# Altium footprint library DrPCB.PcbLib: 910 footprints (part 17 of 57)
Each footprint in its own frame and in the unit in brackets; x right, y up, seen from the top. Pads: shape width x height; smd on the part's side, far side on the other; paste and mask are expansions set on the pad; w line width, h text height; cw(c..) or ccw(c..) is an arc to the next point about the centre after c.
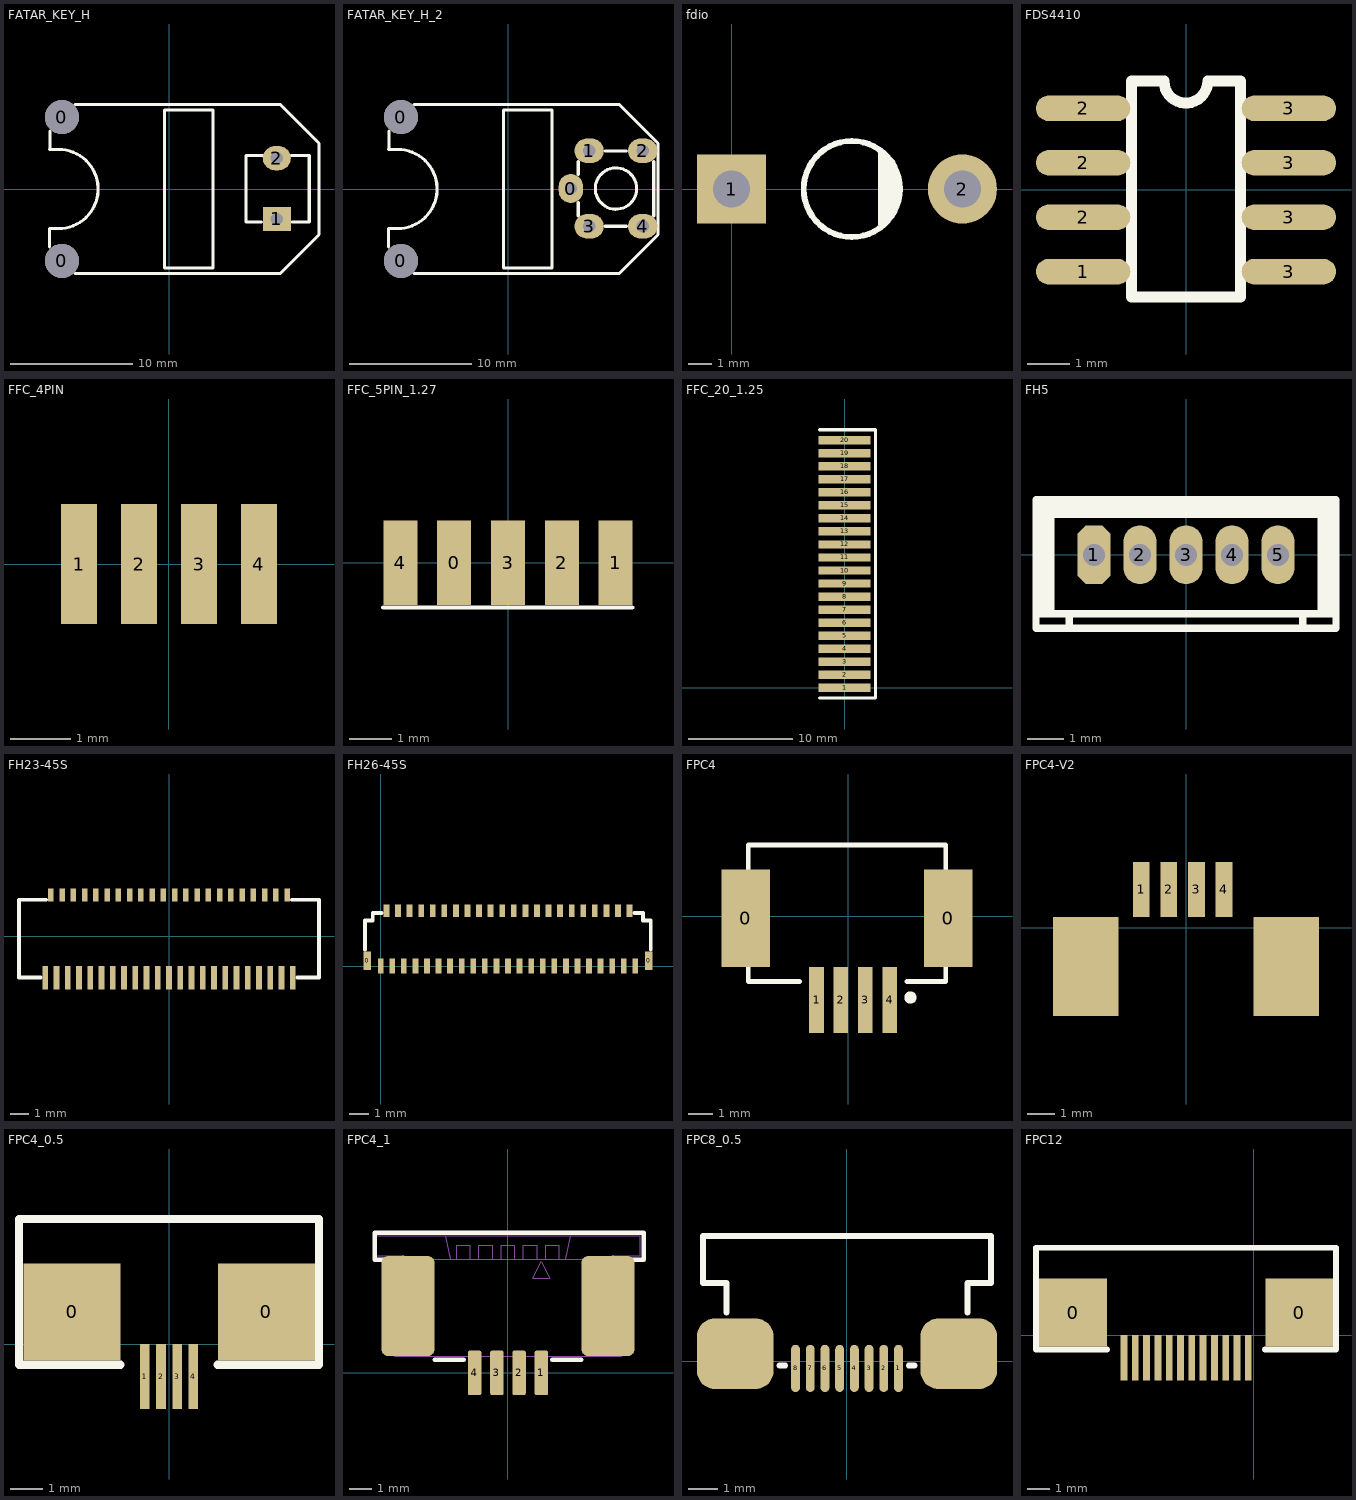
[diagram p16: the footprints below, top view; thin cyan lines are the x and y axes]

## FATAR_KEY_H [mm]
pads (4):
  round 2.8 hole 2.8: 0(-8.827,-5.9) 0(-8.827,5.9)
  rect 2.3x2 hole 1: 1(8.827,-2.462)
  oval 2.3x2 hole 1: 2(8.827,2.538)
Top Overlay:
  lines w0.254: -9.829,-4.762 -9.829,-3.251 -9.817,-3.251 -9.1,-3.251 ccw(c-9.1,-0.001) -9.1,3.249 -9.814,3.249 ; -9.829,3.264 -9.814,3.249 ; -9.814,4.761 -9.814,3.249 ; -7.733,-6.947 9.094,-6.947 ; -7.733,6.95 9.094,6.95 ; 7.57,-2.718 7.568,-2.716 6.287,-2.716 6.287,2.745 7.67,2.745 7.684,2.731 ; 9.093,-6.95 12.293,-3.75 ; 9.093,6.95 12.293,3.75 12.293,-3.75 ; 9.996,2.743 9.998,2.745 11.494,2.745 11.494,-2.716 10.087,-2.716 10.085,-2.718 ; 12.293,-3.75 12.293,-3.75 ; -0.407,-6.5 3.593,-6.5 3.593,6.5 -0.407,6.5 -0.407,-6.5

## FATAR_KEY_H_2 [mm]
pads (7):
  round 2.8 hole 2.8: 0(-8.827,-5.9) 0(-8.827,5.9)
  oval 2x2.4 hole 1: 0(5.14,0.038)
  oval 2.4x2 hole 1: 1(6.64,3.138) 2(11.04,3.138) 3(6.64,-3.062) 4(11.04,-3.062)
Top Overlay:
  circle w0.254: c8.84,0.038 r1.7
  lines w0.254: -9.829,-4.763 -9.829,-3.251 -9.817,-3.251 -9.1,-3.251 ccw(c-9.1,-0.001) -9.1,3.249 -9.814,3.249 ; -9.829,3.264 -9.814,3.249 ; -9.814,4.761 -9.814,3.249 ; -7.733,-6.947 9.094,-6.947 ; -7.733,6.95 9.094,6.95 ; 5.74,-2.197 5.74,-1.105 ; 5.741,1.181 5.741,2.273 ; 7.951,-3.062 9.716,-3.062 ; 7.951,3.138 9.716,3.138 ; 9.093,-6.95 12.293,-3.75 ; 9.093,6.95 12.293,3.75 12.293,-3.75 ; 11.94,-2.197 11.94,2.273 ; 12.293,-3.75 12.293,-3.75 ; -0.407,-6.5 3.593,-6.5 3.593,6.5 -0.407,6.5 -0.407,-6.5

## fdio [mm]
pads (2):
  rect 3x3 hole 1.6: 1(0,0)
  round 3 hole 1.6: 2(10,0)
Top Overlay:
  circle w0.254: c5.207,0 r2.083
  lines w0.254: 6.477,1.651 6.477,-1.524 6.985,-1.016 6.985,1.143 6.858,1.27 6.858,-1.016 ; 6.604,1.524 6.604,-1.27 7.112,-0.762 7.112,0.508

## FDS4410 [mm]
pads (8):
  oval 2.2x0.6 smd: 1(-2.4,-1.905) 2(-2.4,-0.635) 2(-2.4,0.635) 2(-2.4,1.905) 3(2.4,-1.905) 3(2.4,-0.635) 3(2.4,0.635) 3(2.4,1.905)
Top Overlay:
  lines w0.254: -0.513,2.54 ccw(c-0.002,2.54) 0.508,2.54 1.27,2.54 1.27,-2.5 -1.27,-2.5 -1.27,2.54 -0.508,2.54
3D body "User Library-SOIC-8-1.step": height 1.75, standoff 0, extent -3,-2.45 3,2.45

## FFC_4PIN [mm]
pads (4):
  rect 0.6x2 smd: 1(-1.5,0) 2(-0.5,0) 3(0.5,0) 4(1.5,0)

## FFC_5PIN_1.27 [mm]
pads (5):
  rect 0.8x2 smd: 0(-1.27,0) 1(2.54,0) 2(1.27,0) 3(0,0) 4(-2.54,0)
Top Overlay:
  lines w0.1: -2.946,-1.054 2.934,-1.054

## FFC_20_1.25 [mm]
pads (20):
  rect 5x0.8 smd: 1(0,0) 2(0,1.25) 3(0,2.5) 4(0,3.75) 5(0,5) 6(0,6.25) 7(0,7.5) 8(0,8.75) 9(0,10) 10(0,11.25) 11(0,12.5) 12(0,13.75) 13(0,15) 14(0,16.25) 15(0,17.5) 16(0,18.75) 17(0,20) 18(0,21.25) 19(0,22.5) 20(0,23.75)
Top Overlay:
  lines w0.3: -2.375,-0.965 2.972,-0.965 2.972,24.714 ; -2.375,24.74 2.972,24.74

## FH5 [mm] "JST GH Series, pitch: 1.25mm, 1.0A/50v"
pads (5):
  oct 0.9x1.6 hole 0.6: 1(-2.5,0)
  oval 0.9x1.6 hole 0.6: 2(-1.25,0) 3(0,0) 4(1.25,0) 5(2.5,0)
Top Overlay:
  region: -4.075,-1.6 -4.075,1.5 4.075,1.5 4.075,1.1 -3.675,1.1 -3.675,-1.6
  region: 3.675,-1.6 4.075,-1.6 4.075,1.5 3.675,1.5
  lines w0.2: -4.075,-1.6 4.075,-1.6 ; -3.675,-1.6 -3.675,1.1 4.075,1.1 ; -3.175,-2 -3.175,-1.6 ; 3.175,-2 3.175,-1.6 ; 3.675,-1.6 3.675,1.1 ; -4.075,-2 4.075,-2 4.075,1.5 -4.075,1.5 -4.075,-2
3D body "JST - GH - Thru (V) - 5Pin - 1.25mm.stp": height 4.22, standoff -2.26, extent -3.998,-1.93 3.998,1.397

## FH23-45S [mm]
pads (45):
  rect 0.3x1.25 smd: 1(-6.6,-2.212) 3(-6,-2.212) 5(-5.4,-2.212) 7(-4.8,-2.212) 9(-4.2,-2.212) 11(-3.6,-2.212) 13(-3,-2.212) 15(-2.4,-2.212) 17(-1.8,-2.212) 19(-1.2,-2.212) 21(-0.6,-2.212) 23(0,-2.212) 25(0.6,-2.212) 27(1.2,-2.212) 29(1.8,-2.212) 31(2.4,-2.212) 33(3,-2.212) 35(3.6,-2.212) 37(4.2,-2.212) 39(4.8,-2.212) 41(5.4,-2.212) 43(6,-2.212) 45(6.6,-2.212)
  rect 0.3x0.7 smd: 2(-6.3,2.213) 4(-5.7,2.213) 6(-5.1,2.213) 8(-4.5,2.213) 10(-3.9,2.213) 12(-3.3,2.213) 14(-2.7,2.213) 16(-2.1,2.213) 18(-1.5,2.213) 20(-0.9,2.213) 22(-0.3,2.213) 24(0.3,2.213) 26(0.9,2.213) 28(1.5,2.213) 30(2.1,2.213) 32(2.7,2.213) 34(3.3,2.213) 36(3.9,2.213) 38(4.5,2.213) 40(5.1,2.213) 42(5.7,2.213) 44(6.3,2.213)
Top Overlay:
  lines w0.2: -6.858,-2.194 -8,-2.194 -8,1.956 -6.553,1.956 ; 6.553,1.956 8,1.956 8,-2.194 6.858,-2.194

## FH26-45S [mm]
pads (47):
  rect 0.4x0.95 smd: 0(-0.7,0.275) 0(13.9,0.275)
  rect 0.3x0.8 smd: 1(0,0) 3(0.6,0) 5(1.2,0) 7(1.8,0) 9(2.4,0) 11(3,0) 13(3.6,0) 15(4.2,0) 17(4.8,0) 19(5.4,0) 21(6,0) 23(6.6,0) 25(7.2,0) 27(7.8,0) 29(8.4,0) 31(9,0) 33(9.6,0) 35(10.2,0) 37(10.8,0) 39(11.4,0) 41(12,0) 43(12.6,0) 45(13.2,0)
  rect 0.3x0.65 smd: 2(0.3,2.875) 4(0.9,2.875) 6(1.5,2.875) 8(2.1,2.875) 10(2.7,2.875) 12(3.3,2.875) 14(3.9,2.875) 16(4.5,2.875) 18(5.1,2.875) 20(5.7,2.875) 22(6.3,2.875) 24(6.9,2.875) 26(7.5,2.875) 28(8.1,2.875) 30(8.7,2.875) 32(9.3,2.875) 34(9.9,2.875) 36(10.5,2.875) 38(11.1,2.875) 40(11.7,2.875) 42(12.3,2.875) 44(12.9,2.875)
Top Overlay:
  lines w0.2: -0.807,0.85 -0.807,2.35 -0.407,2.35 -0.407,2.75 0.043,2.75 ; 13.15,2.75 13.6,2.75 13.6,2.35 14,2.35 14,0.85

## FPC4 [mm]
pads (6):
  rect 2x4 smd: 0(-4.201,-0.089) 0(4.099,-0.089)
  rect 0.6x2.7 smd: 1(-1.301,-3.441) 2(-0.301,-3.441) 3(0.699,-3.441) 4(1.699,-3.441)
Top Overlay:
  circle w0.25: c2.549,-3.34 r0.125
  lines w0.2: -4.101,-2.095 -4.101,-2.689 -2.001,-2.689 ; -4.101,1.905 -4.101,2.91 3.999,2.91 3.999,1.892 ; 2.399,-2.689 3.999,-2.689 3.999,-2.095

## FPC4-V2 [mm]
pads (6):
  rect 0.61x2 smd: 1(-1.623,1.4) 2(-0.623,1.4) 3(0.377,1.4) 4(1.377,1.4)
  rect 2.38x3.6 smd: ""(-3.637,-1.4) ""(3.637,-1.4)

## FPC4_0.5 [mm]
pads (6):
  rect 3x3 smd: 0(-3.003,1) 0(3.003,1)
  rect 0.3x2 smd: 1(-0.753,-1) 2(-0.253,-1) 3(0.247,-1) 4(0.747,-1)
Top Overlay:
  lines w0.254: -1.505,-0.632 -4.642,-0.632 -4.642,3.868 4.623,3.868 ; 1.492,-0.632 4.629,-0.632 4.629,3.868
3D body "SFV4R-2STE1HLF--3DModel-STEP-56544.STEP": height 1.88, standoff 0.01, extent -3.763,-1.103 3.737,3.797

## FPC4_1 [mm] "TE Connectivity 4-pin ZIF connector TE84953-4"
height 2.74
pads (6):
  rrect25% 0.6x2 smd: 1(1.5,0) 2(0.5,0) 3(-0.5,0) 4(-1.5,0)
  rrect25% 2.4x4.5 smd: ""(-4.5,3.008) ""(4.5,3.008)
Top Overlay:
  lines w0.2: -5.1,4.5 -5.1,5.1 -6,5.1 -6,6.3 6.1,6.3 6.1,5.1 5.1,5.1 5.1,4.5 ; -3.3,0.6 -2,0.6 ; 2,0.6 3.3,0.6
Mechanical 13:
  lines w0.05: -4.56,0.75 -4.56,4.25 -3.47,4.25 -3.47,5.12 ; -4.56,3.2 -4.18,3.2 ; -4.28,4.25 -4.18,3.877 -4.18,2.98 -3.93,2.98 ; -4.229,4.25 -4.232,4.26 -5.072,4.26 ccw(c-5.072,4.16) -5.172,4.16 -5.172,3.859 ccw(c-5.072,3.859) -5.072,3.759 -4.762,3.759 cw(c-4.762,3.659) -4.662,3.659 -4.662,3.357 cw(c-4.762,3.357) -4.762,3.257 -5.072,3.257 ccw(c-5.072,3.157) -5.172,3.157 -5.172,2.856 ccw(c-5.072,2.856) -5.072,2.756 -4.762,2.756 cw(c-4.762,2.656) -4.662,2.656 -4.662,2.355 cw(c-4.762,2.355) -4.762,2.255 -5.072,2.255 ccw(c-5.072,2.155) -5.172,2.155 -5.172,1.853 ccw(c-5.072,1.853) -5.072,1.753 -4.762,1.753 cw(c-4.762,1.653) -4.662,1.653 -4.662,1.352 cw(c-4.762,1.352) -4.762,1.252 -5.072,1.252 ccw(c-5.072,1.152) -5.172,1.152 -5.172,0.85 ccw(c-5.072,0.85) -5.072,0.75 5.072,0.75 ccw(c5.072,0.85) 5.172,0.85 5.172,1.152 ccw(c5.072,1.152) 5.072,1.252 4.762,1.252 cw(c4.762,1.352) 4.662,1.352 4.662,1.653 cw(c4.762,1.653) 4.762,1.753 5.072,1.753 ccw(c5.072,1.853) 5.172,1.853 5.172,2.155 ccw(c5.072,2.155) 5.072,2.255 4.762,2.255 cw(c4.762,2.355) 4.662,2.355 4.662,2.656 cw(c4.762,2.656) 4.762,2.756 5.072,2.756 ccw(c5.072,2.856) 5.172,2.856 5.172,3.157 ccw(c5.072,3.157) 5.072,3.257 4.762,3.257 cw(c4.762,3.357) 4.662,3.357 4.662,3.659 cw(c4.762,3.659) 4.762,3.759 5.072,3.759 ccw(c5.072,3.859) 5.172,3.859 5.172,4.16 ccw(c5.072,4.16) 5.072,4.26 3.982,4.26 3.982,4.25 ; -3.93,0.75 -3.93,3.877 -3.83,4.25 ; -3.646,4.33 -3.55,4.69 -3.55,5.12 3.75,5.12 3.75,4.69 3.847,4.33 ; -3.47,4.33 -4.94,4.33 -4.94,4.73 cw(c-4.76,4.73) -4.76,4.91 ccw(c-4.76,5.09) -4.76,5.27 -5.96,5.27 -5.96,6.16 5.96,6.16 5.96,5.27 4.76,5.27 ccw(c4.76,5.09) 4.76,4.91 cw(c4.76,4.73) 4.94,4.73 4.94,4.33 3.67,4.33 ; -2.82,6.16 -2.59,5.12 ; -2.309,5.12 -2.309,5.75 -1.689,5.75 -1.689,5.12 ; -1.604,-0.26 -1.404,-0.26 ; -1.604,0.11 -1.404,0.11 ; -1.604,0.24 -1.404,0.24 ; -1.604,0.75 -1.604,-0.39 -1.404,-0.39 -1.404,0.75 ; -1.309,5.12 -1.309,5.75 -0.689,5.75 -0.689,5.12 ; -0.604,-0.26 -0.404,-0.26 ; -0.604,0.11 -0.404,0.11 ; -0.604,0.24 -0.404,0.24 ; -0.604,0.75 -0.604,-0.39 -0.404,-0.39 -0.404,0.75 ; -0.309,5.12 -0.309,5.75 0.311,5.75 0.311,5.12 ; 0.396,-0.26 0.596,-0.26 ; 0.396,0.11 0.596,0.11 ; 0.396,0.24 0.596,0.24 ; 0.396,0.75 0.396,-0.39 0.596,-0.39 0.596,0.75 ; 0.691,5.12 0.691,5.75 1.311,5.75 1.311,5.12 ; 1.396,-0.26 1.596,-0.26 ; 1.396,0.11 1.596,0.11 ; 1.396,0.24 1.596,0.24 ; 1.396,0.75 1.396,-0.39 1.596,-0.39 1.596,0.75 ; 1.691,5.12 1.691,5.75 2.311,5.75 2.311,5.12 ; 2.59,5.12 2.82,6.16 ; 3.67,5.12 3.67,4.25 4.56,4.25 4.56,0.75 ; 3.83,0.75 3.93,1.123 3.93,4.25 ; 3.93,2.02 4.56,2.02 ; 4.18,2.02 4.18,1.123 4.28,0.75 ; 4.18,4.25 4.18,4.26 ; 1.111,4.25 1.871,4.25 1.491,5.01 1.111,4.25
3D body "ZIF Conn TE 84953-4.STEP": height 2.58, standoff 0, extent -5.96,-0.39 5.96,6.16

## FPC8_0.5 [mm]
pads (10):
  oval 0.3x1.6 smd mask+0.05: 1(1.75,-0.25) 2(1.25,-0.25) 3(0.75,-0.25) 4(0.25,-0.25) 5(-0.25,-0.25) 6(-0.75,-0.25) 7(-1.25,-0.25) 8(-1.75,-0.25)
  rrect50% 2.6x2.4 smd: ""(-3.8,0.25) ""(3.8,0.25)
Top Overlay:
  lines w0.2: -4.1,1.65 -4.1,2.65 -4.9,2.65 -4.9,4.25 4.9,4.25 4.9,2.65 4.1,2.65 4.1,1.65 ; -2.3,-0.15 -2.1,-0.15 ; 2.1,-0.15 2.3,-0.15
3D body "ssfv8r_2stlf.stp": height 1.82, standoff -0.05, extent -4.75,-0.75 4.75,4.15

## FPC12 [mm]
pads (14):
  rect 3x3 smd: 0(-8,1) 0(2,1)
  rect 0.3x2 smd: 1(-5.75,-1) 2(-5.25,-1) 3(-4.75,-1) 4(-4.25,-1) 5(-3.75,-1) 6(-3.25,-1) 7(-2.75,-1) 8(-2.25,-1) 9(-1.75,-1) 10(-1.25,-1) 11(-0.75,-1) 12(-0.25,-1)
Top Overlay:
  lines w0.254: -6.502,-0.632 -9.639,-0.632 -9.639,3.868 3.619,3.868 ; 0.49,-0.632 3.627,-0.632 3.627,3.868